# Altium footprint library PcbLib.PcbLib: 428 footprints (part 26 of 27)
Each footprint in its own frame and in the unit in brackets; x right, y up, seen from the top. Pads: shape width x height; smd on the part's side, far side on the other; paste and mask are expansions set on the pad; w line width, h text height; cw(c..) or ccw(c..) is an arc to the next point about the centre after c.
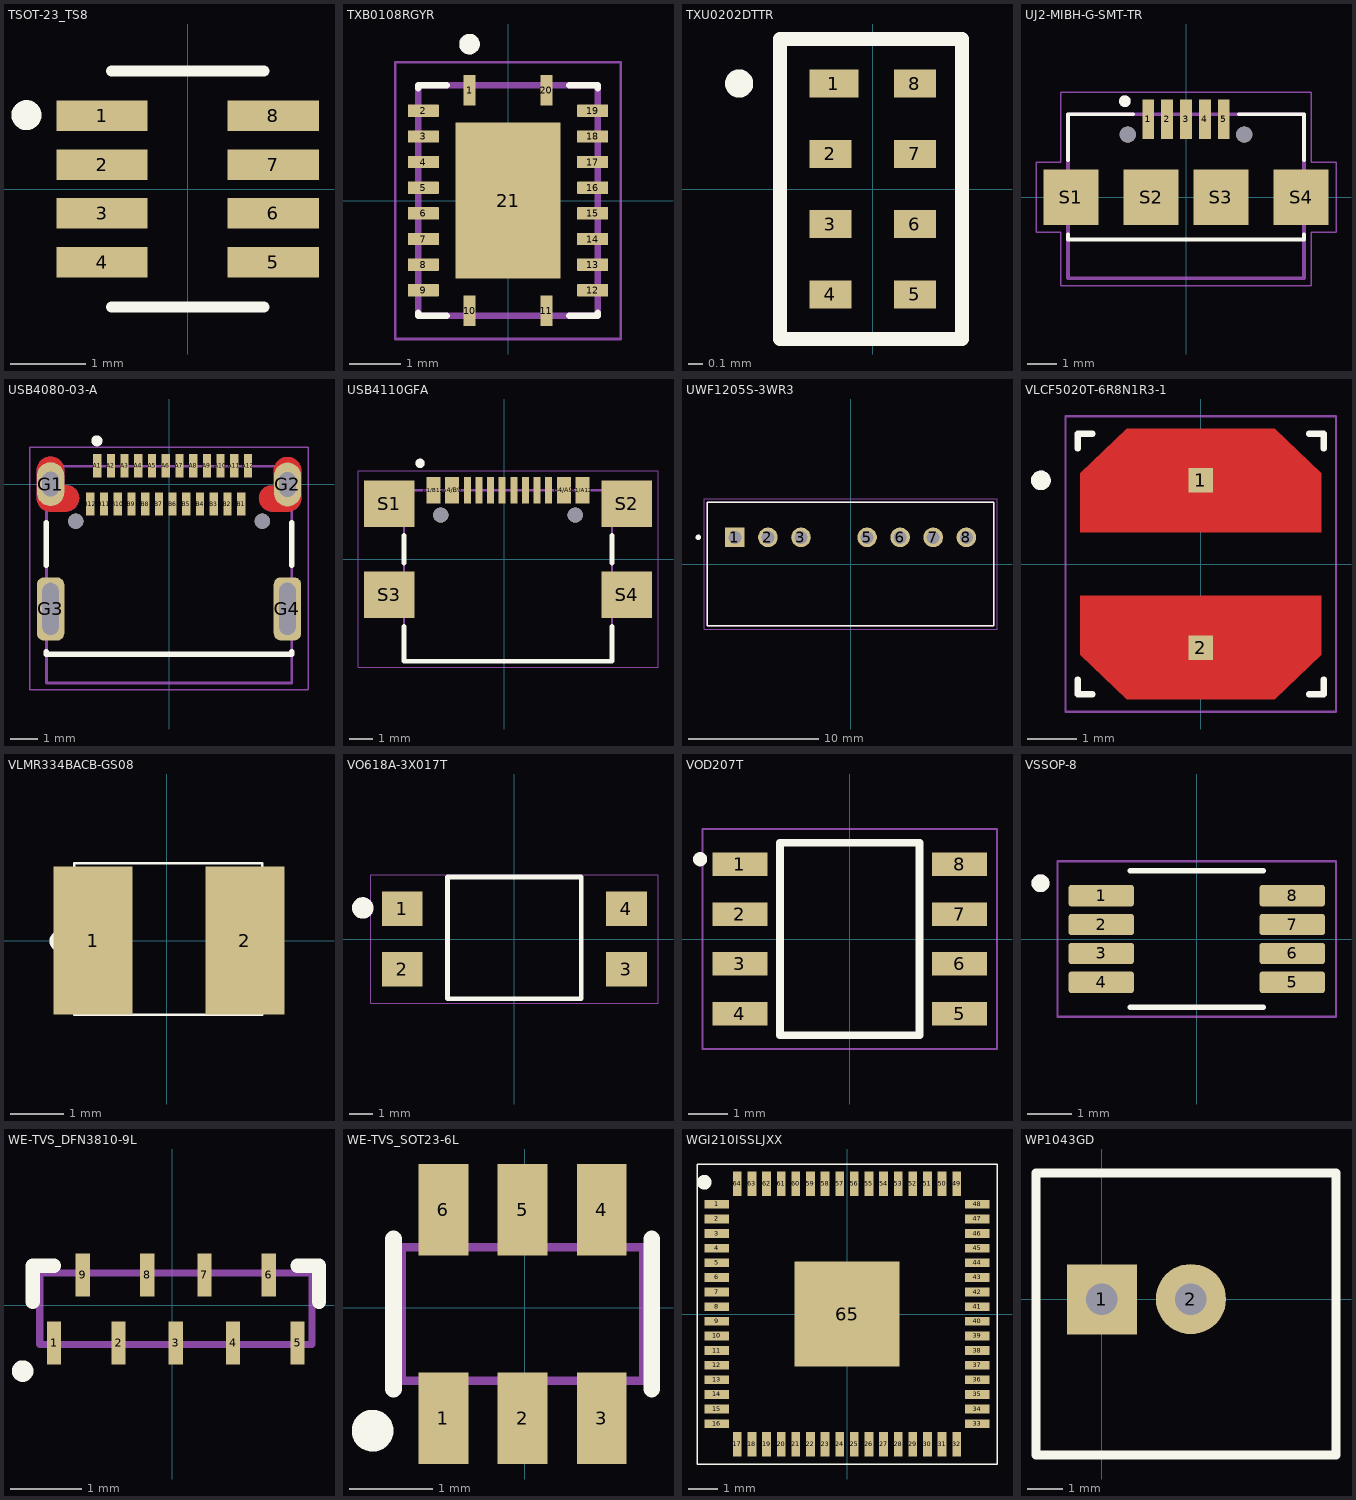
[diagram p25: the footprints below, top view; thin cyan lines are the x and y axes]

## TSOT-23_TS8 [mil]
pads (8):
  rect 48x16 smd: 1(-45,38.39) 2(-45,12.8) 3(-45,-12.8) 4(-45,-38.39) 5(45,-38.39) 6(45,-12.8) 7(45,12.8) 8(45,38.39)
Top Overlay:
  circle w7.87: c-84.69,38.82 r3.94
  lines w6: -40,-62 40,-62 ; -40,62 40,62
3D body "step_temp.STEP": height 35.43, standoff -3.94, extent -55.12,-57.09 55.12,57.09

## TXB0108RGYR [mm]
pads (21):
  rrect5% 0.24x0.6 smd: 1(-0.75,2.15) 10(-0.75,-2.15) 11(0.75,-2.15) 20(0.75,2.15)
  rrect5% 0.6x0.24 smd: 2(-1.65,1.75) 3(-1.65,1.25) 4(-1.65,0.75) 5(-1.65,0.25) 6(-1.65,-0.25) 7(-1.65,-0.75) 8(-1.65,-1.25) 9(-1.65,-1.75) 12(1.65,-1.75) 13(1.65,-1.25) 14(1.65,-0.75) 15(1.65,-0.25) 16(1.65,0.25) 17(1.65,0.75) 18(1.65,1.25) 19(1.65,1.75)
  rect 2.05x3.05 smd paste-3: 21(0,0)
Top Overlay:
  circle w0.2: c-0.75,3.05 r0.1
  lines w0.127: -1.75,-2.19 -1.75,-2.25 -1.19,-2.25 ; -1.75,2.19 -1.75,2.25 -1.19,2.25 ; 1.19,-2.25 1.75,-2.25 1.75,-2.19 ; 1.19,2.25 1.75,2.25 1.75,2.19
Top Paste:
  region: -0.1,0.105 -1.02,0.105 -1.02,1.435 -0.1,1.435
  region: 1.02,-1.435 0.1,-1.435 0.1,-0.105 1.02,-0.105
  region: 1.02,0.105 0.1,0.105 0.1,1.435 1.02,1.435
  region: -0.1,-1.435 -1.02,-1.435 -1.02,-0.105 -0.1,-0.105
Mechanical 13:
  circle w0.2: c-0.75,3.05 r0.1
  lines w0.127: -1.75,-2.25 1.75,-2.25 1.75,2.25 -1.75,2.25 -1.75,-2.25
Mechanical 15:
  lines w0.05: -2.2,-2.7 -2.2,2.7 2.2,2.7 2.2,-2.7 -2.2,-2.7
3D body "step_temp.STEP": height 1, standoff 0, extent -1.75,-2.25 1.75,2.25

## TXU0202DTTR [mm]
pads (8):
  rect 0.35x0.2 smd: 1(-0.275,0.75)
  rect 0.3x0.2 smd: 2(-0.3,0.25) 3(-0.3,-0.25) 4(-0.3,-0.75) 5(0.3,-0.75) 6(0.3,-0.25) 7(0.3,0.25) 8(0.3,0.75)
Top Overlay:
  lines w0.1: -1,0.75 ccw(c-0.95,0.75) -0.9,0.75 ccw(c-0.95,0.75) -1,0.75 ; -0.66,-1.067 0.635,-1.067 0.635,1.067 -0.66,1.067 -0.66,-1.067
3D body "TXU0202DTTR.stp": height 0.6, standoff 0, extent -0.5,-0.975 0.5,0.975

## UJ2-MIBH-G-SMT-TR [mm]
height 2.95
pads (11):
  rect 0.4x1.35 smd: 1(-1.3,2.675) 2(-0.65,2.675) 3(0,2.675) 4(0.65,2.675) 5(1.3,2.675)
  rect 1.9x1.9 smd: S1(-3.95,0) S2(-1.2,0) S3(1.2,0) S4(3.95,0)
  round 0.55 hole 0.55 unplated: ""(-2,2.15) ""(2,2.15)
Top Overlay:
  circle w0.2: c-2.1,3.3 r0.1
  lines w0.127: -4.05,-1.27 -4.05,-1.45 4.05,-1.45 4.05,-1.27 ; -4.05,1.27 -4.05,2.85 -1.82,2.85 ; 1.82,2.85 4.05,2.85 4.05,1.27
Mechanical 13:
  circle w0.2: c-2.1,3.3 r0.1
  lines w0.127: -4.05,-2.78 4.05,-2.78 4.05,2.85 -4.05,2.85 -4.05,-1.45 -4.05,-2.78
Mechanical 15:
  lines w0.05: -5.15,-1.2 -5.15,1.2 -4.3,1.2 -4.3,3.6 4.3,3.6 4.3,1.2 5.15,1.2 5.15,-1.2 4.3,-1.2 4.3,-3.03 -4.3,-3.03 -4.3,-1.2 -5.15,-1.2
3D body "CUI_DEVICES_UJ2-MIBH-G-SMT-TR.step": height 2.65, standoff -0.6, extent -4.05,-2.789 4.05,2.855

## USB4080-03-A [mm]
height 3.16
pads (30):
  rect 0.3x0.85 smd: A1(-2.62,0.675) A2(-2.12,0.675) A3(-1.62,0.675) A4(-1.12,0.675) A5(-0.62,0.675) A6(-0.12,0.675) A7(0.38,0.675) A8(0.88,0.675) A9(1.38,0.675) A10(1.88,0.675) A11(2.38,0.675) A12(2.88,0.675) B1(2.63,-0.725) B2(2.13,-0.725) B3(1.63,-0.725) B4(1.13,-0.725) B5(0.63,-0.725) B6(0.13,-0.725) B7(-0.37,-0.725) B8(-0.87,-0.725) B9(-1.37,-0.725) B10(-1.87,-0.725) B11(-2.37,-0.725) B12(-2.87,-0.725)
  oval 1x1.6 hole 0.6 slot 0.9 at 90 deg mask+0: G1(-4.32,0) G2(4.32,-0.01)
  rrect50% 1x2.3 hole 0.6 slot 1.9 at 90 deg mask+0: G3(-4.32,-4.55) G4(4.318,-4.547)
  round 0.55 hole 0.55 unplated: ""(-3.4,-1.35) ""(3.4,-1.35)
Top Layer:
  region: 182 vertices and 0 holes, not listed, extent -4.82,-1 -3.28,1
  region: 180 vertices and 0 holes, not listed, extent 3.28,-1 4.82,0.99
Bottom Layer:
  region: 182 vertices and 0 holes, not listed, extent -4.82,-1 -3.28,1
  region: 180 vertices and 0 holes, not listed, extent 3.28,-1 4.82,0.99
Top Overlay:
  circle w0.2: c-2.63,1.58 r0.1
  lines w0.2: -4.47,-6.1 -4.47,-6.2 4.47,-6.2 4.47,-6.1 ; -4.47,-2.95 -4.47,-1.4 ; 4.47,-2.95 4.47,-1.4
Top Solder:
  drawing of 2 lines, arcs and shapes, not listed
Bottom Solder:
  drawing of 2 lines, arcs and shapes, not listed
Mechanical 1:
  lines w0: 4,-0.2 ccw(c4.005,-0.185) 4.02,-0.19 4.02,0.5 cw(c4.32,0.5) 4.32,0.8 cw(c4.32,0.5) 4.62,0.5 4.62,-0.5 cw(c4.32,-0.5) 4.32,-0.8 3.72,-0.8 cw(c3.72,-0.5) 3.42,-0.5 cw(c3.72,-0.5) 3.72,-0.2 4,-0.2 ; -4.62,-0.5 ccw(c-4.32,-0.5) -4.32,-0.8 -3.72,-0.8 ccw(c-3.72,-0.5) -3.42,-0.5 ccw(c-3.72,-0.5) -3.72,-0.2 -4,-0.2 cw(c-4,-0.18) -4.02,-0.18 -4.02,0.5 ccw(c-4.32,0.5) -4.32,0.8 ccw(c-4.32,0.5) -4.62,0.5 -4.62,-0.5
Mechanical 13:
  lines w0.1: -4.47,-6.2 -4.47,0.65 4.47,0.65 4.47,-6.2 ; -4.47,-6.2 -4.47,-7.25 4.47,-7.25 4.47,-6.2 ; -4.47,-6.2 4.47,-6.2
Mechanical 15:
  lines w0.05: -5.07,-7.5 -5.07,1.35 5.07,1.35 5.07,-7.5 -5.07,-7.5
3D body "usb4080-03-a.stp": height 3.26, standoff -0.5, extent -4.47,-7.25 4.47,0.85

## USB4110GFA [mm]
pads (18):
  rect 0.6x1.15 smd: A1/B12(-3.048,2.98) A4/B9(-2.248,2.98) B1/A12(3.352,2.98) B4/A9(2.552,2.98)
  rect 0.3x1.15 smd: A5(-1.098,2.98) A6(-0.098,2.98) A7(0.402,2.98) A8(1.402,2.98) B5(1.902,2.98) B6(0.902,2.98) B7(-0.598,2.98) B8(-1.598,2.98)
  rect 2.18x2 smd: S1(-4.958,2.405) S2(5.262,2.405) S3(-4.958,-1.525) S4(5.262,-1.525)
  round 0.65 hole 0.65 unplated: ""(-2.738,1.905) ""(3.042,1.905)
Top Overlay:
  circle w0.2: c-3.628,4.135 r0.1
  lines w0.2: -4.318,-2.885 -4.318,-4.375 4.622,-4.375 4.622,-2.885 ; -4.318,-0.165 -4.318,1.045 ; 4.622,-0.165 4.622,1.045
Mechanical 13:
  circle w0.2: c-3.628,4.135 r0.1
  lines w0.1: -4.318,-4.375 4.622,-4.375 4.622,2.975 -4.318,2.975 -4.318,-4.375
Mechanical 15:
  lines w0.05: -6.298,-4.625 -6.298,3.805 6.602,3.805 6.602,-4.625 -6.298,-4.625
3D body "step_temp.STEP": height 3.26, standoff -0.63, extent -5.498,-4.375 5.802,3.325

## UWF1205S-3WR3 [mm]
height 12.5
pads (7):
  rect 1.508x1.508 / inner round 1.508 / far side rect 1.508x1.508 hole 1: 1(-8.89,2.05)
  round 1.508 hole 1: 2(-6.35,2.05) 3(-3.81,2.05) 5(1.27,2.05) 6(3.81,2.05) 7(6.35,2.05) 8(8.89,2.05)
Top Overlay:
  circle w0.2: c-11.7,2.05 r0.1
  lines w0.127: -11,-4.75 -11,4.75 11,4.75 11,-4.75 -11,-4.75
Mechanical 13:
  circle w0.2: c-11.7,2.05 r0.1
  lines w0.127: -11,-4.75 11,-4.75 11,4.75 -11,4.75 -11,-4.75
Mechanical 15:
  lines w0.05: -11.25,-5 -11.25,5 11.25,5 11.25,-5 -11.25,-5
3D body "step_temp.STEP": height 12, standoff -4.1, extent -11,-4.75 11,4.75

## VLCF5020T-6R8N1R3-1 [mm]
height 2
pads (2):
  rect 0.5x0.5 smd paste-1 mask+0: 1(0,1.7) 2(0,-1.7)
Top Layer:
  region: 2.45,1.85 2.45,0.65 -2.45,0.65 -2.45,1.85 -1.5,2.75 1.5,2.75
  region: 2.45,-1.85 1.5,-2.75 -1.5,-2.75 -2.45,-1.85 -2.45,-0.65 2.45,-0.65
Top Overlay:
  circle w0.2: c-3.25,1.7 r0.1
  lines w0.127: -2.5,-2.35 -2.5,-2.65 -2.2,-2.65 ; -2.5,2.35 -2.5,2.65 -2.2,2.65 ; 2.2,-2.65 2.5,-2.65 2.5,-2.35 ; 2.2,2.65 2.5,2.65 2.5,2.35
Top Paste:
  region: 2.45,1.85 2.45,0.65 -2.45,0.65 -2.45,1.85 -1.5,2.75 1.5,2.75
  region: 2.45,-1.85 1.5,-2.75 -1.5,-2.75 -2.45,-1.85 -2.45,-0.65 2.45,-0.65
Top Solder:
  region: 2.55,1.95 2.55,0.55 -2.55,0.55 -2.55,1.95 -1.6,2.85 1.6,2.85
  region: 2.55,-1.95 1.6,-2.85 -1.6,-2.85 -2.55,-1.95 -2.55,-0.55 2.55,-0.55
Mechanical 13:
  circle w0.2: c-3.25,1.7 r0.1
Mechanical 15:
  lines w0.05: -2.75,-3 -2.75,3 2.75,3 2.75,-3 -2.75,-3
3D body "VLCF5020T-6R8N1R3-1.step": height 2, standoff 0, extent -2.5,-2.525 2.5,2.475

## VLMR334BACB-GS08 [mm]
pads (2):
  rect 1.5x2.8 smd: 1(-1.395,0) 2(1.475,0)
Top Overlay:
  circle w0.2: c-2.018,-0.009 r0.1
  lines w0.05: -1.753,-1.4 -1.753,1.46 1.8,1.46 1.8,-1.4 -1.753,-1.4
3D body "82548PLCC-2_package_3D.stp": height 1.65, standoff 0, extent -1.739,-1.38 1.759,1.42

## VO618A-3X017T [mm]
pads (4):
  rect 1.7x1.45 smd: 1(-4.7,1.27) 2(-4.7,-1.27) 3(4.7,-1.27) 4(4.7,1.27)
Top Overlay:
  circle w0.5: c-6.35,1.3 r0.2
  lines w0.2: -2.8,-2.5 2.8,-2.5 2.8,2.6 -2.8,2.6 -2.8,-2.5
Mechanical 15:
  lines w0.05: -6.02,-2.7 6.02,-2.7 6.02,2.7 -6.02,2.7 -6.02,-2.7
3D body "SMD-4-OPT7_VO618A_VIS.step": height 4.4, standoff 0, extent -5.282,-2.388 5.182,2.488

## VOD207T [mm]
pads (8):
  rect 1.4x0.6 smd: 1(-2.8,1.905) 2(-2.8,0.635) 3(-2.8,-0.635) 4(-2.8,-1.905) 5(2.8,-1.905) 6(2.8,-0.635) 7(2.8,0.635) 8(2.8,1.905)
Top Overlay:
  circle w0.2: c-3.81,2.032 r0.08
  lines w0.2: -1.775,-2.45 1.775,-2.45 1.775,2.45 -1.775,2.45 -1.775,-2.45
Mechanical 15:
  lines w0.05: -3.75,-2.8 3.75,-2.8 3.75,2.8 -3.75,2.8 -3.75,-2.8
3D body "VOD207T.STEP": height 3.51, standoff 0, extent -3.05,-2.655 3.05,2.655

## VSSOP-8 [mm]
pads (8):
  rrect25% 1.47x0.48 smd: 1(-2.15,0.975) 2(-2.15,0.325) 3(-2.15,-0.325) 4(-2.15,-0.975) 5(2.15,-0.975) 6(2.15,-0.325) 7(2.15,0.325) 8(2.15,0.975)
Top Overlay:
  circle w0.2: c-3.52,1.255 r0.1
  lines w0.127: -1.5,-1.535 1.5,-1.535 ; -1.5,1.535 1.5,1.535
Mechanical 13:
  circle w0.2: c-3.52,1.255 r0.1
Mechanical 15:
  lines w0.05: -3.135,-1.75 3.135,-1.75 3.135,1.75 -3.135,1.75 -3.135,-1.75
3D body "INA152EA_250.STEP": height 1.1, standoff 0, extent -2.475,-1.524 2.425,1.476

## WE-TVS_DFN3810-9L [mm]
pads (9):
  rect 0.2x0.6 smd: 1(-1.649,-0.526) 2(-0.749,-0.526) 3(0.051,-0.526) 4(0.851,-0.526) 5(1.751,-0.526) 6(1.351,0.424) 7(0.451,0.424) 8(-0.349,0.424) 9(-1.249,0.424)
Top Overlay:
  circle w0.2: c-2.089,-0.921 r0.05
  lines w0.2: -1.949,0.049 -1.949,0.549 -1.649,0.549 ; 1.751,0.549 2.051,0.549 2.051,0.049
Mechanical 13:
  lines w0.1: -1.849,-0.551 -1.849,0.449 1.951,0.449 1.951,-0.551 -1.849,-0.551
3D body "step_temp.STEP": height 0.5, standoff 0, extent -1.849,-0.551 1.951,0.449

## WE-TVS_SOT23-6L [mm]
pads (6):
  rect 0.6x1.1 smd paste+0 mask+0.102: 1(-0.975,-1.326) 2(-0.025,-1.326) 3(0.925,-1.326) 4(0.925,1.174) 5(-0.025,1.174) 6(-0.975,1.174)
Top Overlay:
  circle w0.3: c-1.825,-1.476 r0.1
  lines w0.2: -1.575,-0.976 -1.575,0.824 ; 1.525,-0.976 1.525,0.824
Mechanical 13:
  lines w0.1: -1.175,-0.876 -1.175,-1.476 -0.775,-1.476 -0.775,-0.876 ; -0.225,-0.876 -0.225,-1.476 0.175,-1.476 0.175,-0.876 ; -0.225,0.724 -0.225,1.324 0.175,1.324 0.175,0.724 ; 0.725,-0.876 0.725,-1.476 1.125,-1.476 1.125,-0.876 ; 0.725,0.724 0.725,1.324 1.125,1.324 1.125,0.724 ; -1.175,0.724 -1.175,1.324 -0.775,1.324 -0.775,0.724 ; -1.175,0.724 -1.475,0.724 -1.475,-0.876 1.425,-0.876 1.425,0.724 -0.775,0.724 ; -1.175,0.724 -0.775,0.724
3D body "step_temp.STEP": height 1.16, standoff 0, extent -1.475,-1.476 1.425,1.324

## WGI210ISSLJXX [mm]
pads (65):
  rect 0.85x0.3 smd: 1(-4.45,3.75) 2(-4.45,3.25) 3(-4.45,2.75) 4(-4.45,2.25) 5(-4.45,1.75) 6(-4.45,1.25) 7(-4.45,0.75) 8(-4.45,0.25) 9(-4.45,-0.25) 10(-4.45,-0.75) 11(-4.45,-1.25) 12(-4.45,-1.75) 13(-4.45,-2.25) 14(-4.45,-2.75) 15(-4.45,-3.25) 16(-4.45,-3.75) 33(4.45,-3.75) 34(4.45,-3.25) 35(4.45,-2.75) 36(4.45,-2.25) 37(4.45,-1.75) 38(4.45,-1.25) 39(4.45,-0.75) 40(4.45,-0.25) 41(4.45,0.25) 42(4.45,0.75) 43(4.45,1.25) 44(4.45,1.75) 45(4.45,2.25) 46(4.45,2.75) 47(4.45,3.25) 48(4.45,3.75)
  rect 0.3x0.85 smd: 17(-3.75,-4.45) 18(-3.25,-4.45) 19(-2.75,-4.45) 20(-2.25,-4.45) 21(-1.75,-4.45) 22(-1.25,-4.45) 23(-0.75,-4.45) 24(-0.25,-4.45) 25(0.25,-4.45) 26(0.75,-4.45) 27(1.25,-4.45) 28(1.75,-4.45) 29(2.25,-4.45) 30(2.75,-4.45) 31(3.25,-4.45) 32(3.75,-4.45) 49(3.75,4.45) 50(3.25,4.45) 51(2.75,4.45) 52(2.25,4.45) 53(1.75,4.45) 54(1.25,4.45) 55(0.75,4.45) 56(0.25,4.45) 57(-0.25,4.45) 58(-0.75,4.45) 59(-1.25,4.45) 60(-1.75,4.45) 61(-2.25,4.45) 62(-2.75,4.45) 63(-3.25,4.45) 64(-3.75,4.45)
  rect 3.6x3.6 smd: 65(0,0)
Top Overlay:
  circle w0.25: c-4.875,4.5 r0.125
  lines w0.05: -5.125,-5.125 -5.125,5.125 5.125,5.125 5.125,-5.125 -5.125,-5.125
3D body "WGI210IS_S_LJXX.stp": height 1, standoff 0, extent -4.55,-4.55 4.55,4.55

## WP1043GD [mm]
pads (2):
  rect 2x2 hole 0.9: 1(0,0)
  round 2 hole 0.9: 2(2.54,0.008)
Top Overlay:
  lines w0.254: -1.88,-4.445 -1.88,3.607 6.68,3.607 6.68,-4.445 -1.88,-4.445
3D body "1043.sldprt": height 6.9, standoff -26.9, extent -1.83,-1.774 4.32,1.876